# Altium footprint library ST封装.PcbLib: 1336 footprints (part 85 of 109) (continued)
## SQFP28X28-360(T) [mm]
pads (360):
  rect 0.2x1.6 smd: 1(0,0)
  oval 0.2x1.6 smd: 2(-0.3,0) 3(-0.6,0) 4(-0.9,0) 5(-1.2,0) 6(-1.5,0) 7(-1.8,0) 8(-2.1,0) 9(-2.4,0) 10(-2.7,0) 11(-3,0) 12(-3.3,0) 13(-3.6,0) 14(-3.9,0) 15(-4.2,0) 16(-4.5,0) 17(-4.8,0) 18(-5.1,0) 19(-5.4,0) 20(-5.7,0) 21(-6,0) 22(-6.3,0) 23(-6.6,0) 24(-6.9,0) 25(-7.2,0) 26(-7.5,0) 27(-7.8,0) 28(-8.1,0) 29(-8.4,0) 30(-8.7,0) 31(-9,0) 32(-9.3,0) 33(-9.6,0) 34(-9.9,0) 35(-10.2,0) 36(-10.5,0) 37(-10.8,0) 38(-11.1,0) 39(-11.4,0) 40(-11.7,0) 41(-12,0) 42(-12.3,0) 43(-12.6,0) 44(-12.9,0) 45(-13.2,0) 136(-13.2,-29.4) 137(-12.9,-29.4) 138(-12.6,-29.4) 139(-12.3,-29.4) 140(-12,-29.4) 141(-11.7,-29.4) 142(-11.4,-29.4) 143(-11.1,-29.4) 144(-10.8,-29.4) 145(-10.5,-29.4) 146(-10.2,-29.4) 147(-9.9,-29.4) 148(-9.6,-29.4) 149(-9.3,-29.4) 150(-9,-29.4) 151(-8.7,-29.4) 152(-8.4,-29.4) 153(-8.1,-29.4) 154(-7.8,-29.4) 155(-7.5,-29.4) 156(-7.2,-29.4) 157(-6.9,-29.4) 158(-6.6,-29.4) 159(-6.3,-29.4) 160(-6,-29.4) 161(-5.7,-29.4) 162(-5.4,-29.4) 163(-5.1,-29.4) 164(-4.8,-29.4) 165(-4.5,-29.4) 166(-4.2,-29.4) 167(-3.9,-29.4) 168(-3.6,-29.4) 169(-3.3,-29.4) 170(-3,-29.4) 171(-2.7,-29.4) 172(-2.4,-29.4) 173(-2.1,-29.4) 174(-1.8,-29.4) 175(-1.5,-29.4) 176(-1.2,-29.4) 177(-0.9,-29.4) 178(-0.6,-29.4) 179(-0.3,-29.4) 180(0,-29.4) 181(0.3,-29.4) 182(0.6,-29.4) 183(0.9,-29.4) 184(1.2,-29.4) 185(1.5,-29.4) 186(1.8,-29.4) 187(2.1,-29.4) 188(2.4,-29.4) 189(2.7,-29.4) 190(3,-29.4) 191(3.3,-29.4) 192(3.6,-29.4) 193(3.9,-29.4) 194(4.2,-29.4) 195(4.5,-29.4) 196(4.8,-29.4) 197(5.1,-29.4) 198(5.4,-29.4) 199(5.7,-29.4) 200(6,-29.4) 201(6.3,-29.4) 202(6.6,-29.4) 203(6.9,-29.4) 204(7.2,-29.4) 205(7.5,-29.4) 206(7.8,-29.4) 207(8.1,-29.4) 208(8.4,-29.4) 209(8.7,-29.4) 210(9,-29.4) 211(9.3,-29.4) 212(9.6,-29.4) 213(9.9,-29.4) 214(10.2,-29.4) 215(10.5,-29.4) 216(10.8,-29.4) 217(11.1,-29.4) 218(11.4,-29.4) 219(11.7,-29.4) 220(12,-29.4) 221(12.3,-29.4) 222(12.6,-29.4) 223(12.9,-29.4) 224(13.2,-29.4) 225(13.5,-29.4) 316(13.5,0) 317(13.2,0) 318(12.9,0) 319(12.6,0) 320(12.3,0) 321(12,0) 322(11.7,0) 323(11.4,0) 324(11.1,0) 325(10.8,0) 326(10.5,0) 327(10.2,0) 328(9.9,0) 329(9.6,0) 330(9.3,0) 331(9,0) 332(8.7,0) 333(8.4,0) 334(8.1,0) 335(7.8,0) 336(7.5,0) 337(7.2,0) 338(6.9,0) 339(6.6,0) 340(6.3,0) 341(6,0) 342(5.7,0) 343(5.4,0) 344(5.1,0) 345(4.8,0) 346(4.5,0) 347(4.2,0) 348(3.9,0) 349(3.6,0) 350(3.3,0) 351(3,0) 352(2.7,0) 353(2.4,0) 354(2.1,0) 355(1.8,0) 356(1.5,0) 357(1.2,0) 358(0.9,0) 359(0.6,0) 360(0.3,0)
  oval 1.6x0.2 smd: 46(-14.55,-1.35) 47(-14.55,-1.65) 48(-14.55,-1.95) 49(-14.55,-2.25) 50(-14.55,-2.55) 51(-14.55,-2.85) 52(-14.55,-3.15) 53(-14.55,-3.45) 54(-14.55,-3.75) 55(-14.55,-4.05) 56(-14.55,-4.35) 57(-14.55,-4.65) 58(-14.55,-4.95) 59(-14.55,-5.25) 60(-14.55,-5.55) 61(-14.55,-5.85) 62(-14.55,-6.15) 63(-14.55,-6.45) 64(-14.55,-6.75) 65(-14.55,-7.05) 66(-14.55,-7.35) 67(-14.55,-7.65) 68(-14.55,-7.95) 69(-14.55,-8.25) 70(-14.55,-8.55) 71(-14.55,-8.85) 72(-14.55,-9.15) 73(-14.55,-9.45) 74(-14.55,-9.75) 75(-14.55,-10.05) 76(-14.55,-10.35) 77(-14.55,-10.65) 78(-14.55,-10.95) 79(-14.55,-11.25) 80(-14.55,-11.55) 81(-14.55,-11.85) 82(-14.55,-12.15) 83(-14.55,-12.45) 84(-14.55,-12.75) 85(-14.55,-13.05) 86(-14.55,-13.35) 87(-14.55,-13.65) 88(-14.55,-13.95) 89(-14.55,-14.25) 90(-14.55,-14.55) 91(-14.55,-14.85) 92(-14.55,-15.15) 93(-14.55,-15.45) 94(-14.55,-15.75) 95(-14.55,-16.05) 96(-14.55,-16.35) 97(-14.55,-16.65) 98(-14.55,-16.95) 99(-14.55,-17.25) 100(-14.55,-17.55) 101(-14.55,-17.85) 102(-14.55,-18.15) 103(-14.55,-18.45) 104(-14.55,-18.75) 105(-14.55,-19.05) 106(-14.55,-19.35) 107(-14.55,-19.65) 108(-14.55,-19.95) 109(-14.55,-20.25) 110(-14.55,-20.55) 111(-14.55,-20.85) 112(-14.55,-21.15) 113(-14.55,-21.45) 114(-14.55,-21.75) 115(-14.55,-22.05) 116(-14.55,-22.35) 117(-14.55,-22.65) 118(-14.55,-22.95) 119(-14.55,-23.25) 120(-14.55,-23.55) 121(-14.55,-23.85) 122(-14.55,-24.15) 123(-14.55,-24.45) 124(-14.55,-24.75) 125(-14.55,-25.05) 126(-14.55,-25.35) 127(-14.55,-25.65) 128(-14.55,-25.95) 129(-14.55,-26.25) 130(-14.55,-26.55) 131(-14.55,-26.85) 132(-14.55,-27.15) 133(-14.55,-27.45) 134(-14.55,-27.75) 135(-14.55,-28.05) 226(14.85,-28.05) 227(14.85,-27.75) 228(14.85,-27.45) 229(14.85,-27.15) 230(14.85,-26.85) 231(14.85,-26.55) 232(14.85,-26.25) 233(14.85,-25.95) 234(14.85,-25.65) 235(14.85,-25.35) 236(14.85,-25.05) 237(14.85,-24.75) 238(14.85,-24.45) 239(14.85,-24.15) 240(14.85,-23.85) 241(14.85,-23.55) 242(14.85,-23.25) 243(14.85,-22.95) 244(14.85,-22.65) 245(14.85,-22.35) 246(14.85,-22.05) 247(14.85,-21.75) 248(14.85,-21.45) 249(14.85,-21.15) 250(14.85,-20.85) 251(14.85,-20.55) 252(14.85,-20.25) 253(14.85,-19.95) 254(14.85,-19.65) 255(14.85,-19.35) 256(14.85,-19.05) 257(14.85,-18.75) 258(14.85,-18.45) 259(14.85,-18.15) 260(14.85,-17.85) 261(14.85,-17.55) 262(14.85,-17.25) 263(14.85,-16.95) 264(14.85,-16.65) 265(14.85,-16.35) 266(14.85,-16.05) 267(14.85,-15.75) 268(14.85,-15.45) 269(14.85,-15.15) 270(14.85,-14.85) 271(14.85,-14.55) 272(14.85,-14.25) 273(14.85,-13.95) 274(14.85,-13.65) 275(14.85,-13.35) 276(14.85,-13.05) 277(14.85,-12.75) 278(14.85,-12.45) 279(14.85,-12.15) 280(14.85,-11.85) 281(14.85,-11.55) 282(14.85,-11.25) 283(14.85,-10.95) 284(14.85,-10.65) 285(14.85,-10.35) 286(14.85,-10.05) 287(14.85,-9.75) 288(14.85,-9.45) 289(14.85,-9.15) 290(14.85,-8.85) 291(14.85,-8.55) 292(14.85,-8.25) 293(14.85,-7.95) 294(14.85,-7.65) 295(14.85,-7.35) 296(14.85,-7.05) 297(14.85,-6.75) 298(14.85,-6.45) 299(14.85,-6.15) 300(14.85,-5.85) 301(14.85,-5.55) 302(14.85,-5.25) 303(14.85,-4.95) 304(14.85,-4.65) 305(14.85,-4.35) 306(14.85,-4.05) 307(14.85,-3.75) 308(14.85,-3.45) 309(14.85,-3.15) 310(14.85,-2.85) 311(14.85,-2.55) 312(14.85,-2.25) 313(14.85,-1.95) 314(14.85,-1.65) 315(14.85,-1.35)
Top Overlay:
  lines w0.2: -14.95,-28.65 -14.95,-29.8 -13.8,-29.8 ; -14.95,-0.75 -14.95,-0.4 -14.15,0.4 -13.8,0.4 ; 14.1,-29.8 15.25,-29.8 15.25,-28.65 ; 14.1,0.4 15.25,0.4 15.25,-0.75

## SQFP28X40-256(N) [mm]
pads (256):
  rect 1.6x0.4 smd: 1(0,0)
  oval 1.6x0.4 smd: 2(0,-0.5) 3(0,-1) 4(0,-1.5) 5(0,-2) 6(0,-2.5) 7(0,-3) 8(0,-3.5) 9(0,-4) 10(0,-4.5) 11(0,-5) 12(0,-5.5) 13(0,-6) 14(0,-6.5) 15(0,-7) 16(0,-7.5) 17(0,-8) 18(0,-8.5) 19(0,-9) 20(0,-9.5) 21(0,-10) 22(0,-10.5) 23(0,-11) 24(0,-11.5) 25(0,-12) 26(0,-12.5) 27(0,-13) 28(0,-13.5) 29(0,-14) 30(0,-14.5) 31(0,-15) 32(0,-15.5) 33(0,-16) 34(0,-16.5) 35(0,-17) 36(0,-17.5) 37(0,-18) 38(0,-18.5) 39(0,-19) 40(0,-19.5) 41(0,-20) 42(0,-20.5) 43(0,-21) 44(0,-21.5) 45(0,-22) 46(0,-22.5) 47(0,-23) 48(0,-23.5) 49(0,-24) 50(0,-24.5) 51(0,-25) 52(0,-25.5) 53(0,-26) 54(0,-26.5) 55(0,-27) 56(0,-27.5) 57(0,-28) 58(0,-28.5) 59(0,-29) 60(0,-29.5) 61(0,-30) 62(0,-30.5) 63(0,-31) 64(0,-31.5) 65(0,-32) 66(0,-32.5) 67(0,-33) 68(0,-33.5) 69(0,-34) 70(0,-34.5) 71(0,-35) 72(0,-35.5) 73(0,-36) 74(0,-36.5) 75(0,-37) 76(0,-37.5) 129(29.4,-37.5) 130(29.4,-37) 131(29.4,-36.5) 132(29.4,-36) 133(29.4,-35.5) 134(29.4,-35) 135(29.4,-34.5) 136(29.4,-34) 137(29.4,-33.5) 138(29.4,-33) 139(29.4,-32.5) 140(29.4,-32) 141(29.4,-31.5) 142(29.4,-31) 143(29.4,-30.5) 144(29.4,-30) 145(29.4,-29.5) 146(29.4,-29) 147(29.4,-28.5) 148(29.4,-28) 149(29.4,-27.5) 150(29.4,-27) 151(29.4,-26.5) 152(29.4,-26) 153(29.4,-25.5) 154(29.4,-25) 155(29.4,-24.5) 156(29.4,-24) 157(29.4,-23.5) 158(29.4,-23) 159(29.4,-22.5) 160(29.4,-22) 161(29.4,-21.5) 162(29.4,-21) 163(29.4,-20.5) 164(29.4,-20) 165(29.4,-19.5) 166(29.4,-19) 167(29.4,-18.5) 168(29.4,-18) 169(29.4,-17.5) 170(29.4,-17) 171(29.4,-16.5) 172(29.4,-16) 173(29.4,-15.5) 174(29.4,-15) 175(29.4,-14.5) 176(29.4,-14) 177(29.4,-13.5) 178(29.4,-13) 179(29.4,-12.5) 180(29.4,-12) 181(29.4,-11.5) 182(29.4,-11) 183(29.4,-10.5) 184(29.4,-10) 185(29.4,-9.5) 186(29.4,-9) 187(29.4,-8.5) 188(29.4,-8) 189(29.4,-7.5) 190(29.4,-7) 191(29.4,-6.5) 192(29.4,-6) 193(29.4,-5.5) 194(29.4,-5) 195(29.4,-4.5) 196(29.4,-4) 197(29.4,-3.5) 198(29.4,-3) 199(29.4,-2.5) 200(29.4,-2) 201(29.4,-1.5) 202(29.4,-1) 203(29.4,-0.5) 204(29.4,0)
  oval 0.4x1.6 smd: 77(1.95,-39.45) 78(2.45,-39.45) 79(2.95,-39.45) 80(3.45,-39.45) 81(3.95,-39.45) 82(4.45,-39.45) 83(4.95,-39.45) 84(5.45,-39.45) 85(5.95,-39.45) 86(6.45,-39.45) 87(6.95,-39.45) 88(7.45,-39.45) 89(7.95,-39.45) 90(8.45,-39.45) 91(8.95,-39.45) 92(9.45,-39.45) 93(9.95,-39.45) 94(10.45,-39.45) 95(10.95,-39.45) 96(11.45,-39.45) 97(11.95,-39.45) 98(12.45,-39.45) 99(12.95,-39.45) 100(13.45,-39.45) 101(13.95,-39.45) 102(14.45,-39.45) 103(14.95,-39.45) 104(15.45,-39.45) 105(15.95,-39.45) 106(16.45,-39.45) 107(16.95,-39.45) 108(17.45,-39.45) 109(17.95,-39.45) 110(18.45,-39.45) 111(18.95,-39.45) 112(19.45,-39.45) 113(19.95,-39.45) 114(20.45,-39.45) 115(20.95,-39.45) 116(21.45,-39.45) 117(21.95,-39.45) 118(22.45,-39.45) 119(22.95,-39.45) 120(23.45,-39.45) 121(23.95,-39.45) 122(24.45,-39.45) 123(24.95,-39.45) 124(25.45,-39.45) 125(25.95,-39.45) 126(26.45,-39.45) 127(26.95,-39.45) 128(27.45,-39.45) 205(27.45,1.95) 206(26.95,1.95) 207(26.45,1.95) 208(25.95,1.95) 209(25.45,1.95) 210(24.95,1.95) 211(24.45,1.95) 212(23.95,1.95) 213(23.45,1.95) 214(22.95,1.95) 215(22.45,1.95) 216(21.95,1.95) 217(21.45,1.95) 218(20.95,1.95) 219(20.45,1.95) 220(19.95,1.95) 221(19.45,1.95) 222(18.95,1.95) 223(18.45,1.95) 224(17.95,1.95) 225(17.45,1.95) 226(16.95,1.95) 227(16.45,1.95) 228(15.95,1.95) 229(15.45,1.95) 230(14.95,1.95) 231(14.45,1.95) 232(13.95,1.95) 233(13.45,1.95) 234(12.95,1.95) 235(12.45,1.95) 236(11.95,1.95) 237(11.45,1.95) 238(10.95,1.95) 239(10.45,1.95) 240(9.95,1.95) 241(9.45,1.95) 242(8.95,1.95) 243(8.45,1.95) 244(7.95,1.95) 245(7.45,1.95) 246(6.95,1.95) 247(6.45,1.95) 248(5.95,1.95) 249(5.45,1.95) 250(4.95,1.95) 251(4.45,1.95) 252(3.95,1.95) 253(3.45,1.95) 254(2.95,1.95) 255(2.45,1.95) 256(1.95,1.95)
Top Overlay:
  lines w0.2: -0.4,-38.2 -0.4,-39.85 1.25,-39.85 ; -0.4,0.7 -0.4,1.55 0.4,2.35 1.25,2.35 ; 28.15,-39.85 29.8,-39.85 29.8,-38.2 ; 28.15,2.35 29.8,2.35 29.8,0.7

## SQFP28X40-256(T) [mm]
pads (256):
  rect 0.4x1.6 smd: 1(0,0)
  oval 0.4x1.6 smd: 2(-0.5,0) 3(-1,0) 4(-1.5,0) 5(-2,0) 6(-2.5,0) 7(-3,0) 8(-3.5,0) 9(-4,0) 10(-4.5,0) 11(-5,0) 12(-5.5,0) 13(-6,0) 14(-6.5,0) 15(-7,0) 16(-7.5,0) 17(-8,0) 18(-8.5,0) 19(-9,0) 20(-9.5,0) 21(-10,0) 22(-10.5,0) 23(-11,0) 24(-11.5,0) 25(-12,0) 26(-12.5,0) 103(-12.5,-41.4) 104(-12,-41.4) 105(-11.5,-41.4) 106(-11,-41.4) 107(-10.5,-41.4) 108(-10,-41.4) 109(-9.5,-41.4) 110(-9,-41.4) 111(-8.5,-41.4) 112(-8,-41.4) 113(-7.5,-41.4) 114(-7,-41.4) 115(-6.5,-41.4) 116(-6,-41.4) 117(-5.5,-41.4) 118(-5,-41.4) 119(-4.5,-41.4) 120(-4,-41.4) 121(-3.5,-41.4) 122(-3,-41.4) 123(-2.5,-41.4) 124(-2,-41.4) 125(-1.5,-41.4) 126(-1,-41.4) 127(-0.5,-41.4) 128(0,-41.4) 129(0.5,-41.4) 130(1,-41.4) 131(1.5,-41.4) 132(2,-41.4) 133(2.5,-41.4) 134(3,-41.4) 135(3.5,-41.4) 136(4,-41.4) 137(4.5,-41.4) 138(5,-41.4) 139(5.5,-41.4) 140(6,-41.4) 141(6.5,-41.4) 142(7,-41.4) 143(7.5,-41.4) 144(8,-41.4) 145(8.5,-41.4) 146(9,-41.4) 147(9.5,-41.4) 148(10,-41.4) 149(10.5,-41.4) 150(11,-41.4) 151(11.5,-41.4) 152(12,-41.4) 153(12.5,-41.4) 154(13,-41.4) 231(13,0) 232(12.5,0) 233(12,0) 234(11.5,0) 235(11,0) 236(10.5,0) 237(10,0) 238(9.5,0) 239(9,0) 240(8.5,0) 241(8,0) 242(7.5,0) 243(7,0) 244(6.5,0) 245(6,0) 246(5.5,0) 247(5,0) 248(4.5,0) 249(4,0) 250(3.5,0) 251(3,0) 252(2.5,0) 253(2,0) 254(1.5,0) 255(1,0) 256(0.5,0)
  oval 1.6x0.4 smd: 27(-14.45,-1.95) 28(-14.45,-2.45) 29(-14.45,-2.95) 30(-14.45,-3.45) 31(-14.45,-3.95) 32(-14.45,-4.45) 33(-14.45,-4.95) 34(-14.45,-5.45) 35(-14.45,-5.95) 36(-14.45,-6.45) 37(-14.45,-6.95) 38(-14.45,-7.45) 39(-14.45,-7.95) 40(-14.45,-8.45) 41(-14.45,-8.95) 42(-14.45,-9.45) 43(-14.45,-9.95) 44(-14.45,-10.45) 45(-14.45,-10.95) 46(-14.45,-11.45) 47(-14.45,-11.95) 48(-14.45,-12.45) 49(-14.45,-12.95) 50(-14.45,-13.45) 51(-14.45,-13.95) 52(-14.45,-14.45) 53(-14.45,-14.95) 54(-14.45,-15.45) 55(-14.45,-15.95) 56(-14.45,-16.45) 57(-14.45,-16.95) 58(-14.45,-17.45) 59(-14.45,-17.95) 60(-14.45,-18.45) 61(-14.45,-18.95) 62(-14.45,-19.45) 63(-14.45,-19.95) 64(-14.45,-20.45) 65(-14.45,-20.95) 66(-14.45,-21.45) 67(-14.45,-21.95) 68(-14.45,-22.45) 69(-14.45,-22.95) 70(-14.45,-23.45) 71(-14.45,-23.95) 72(-14.45,-24.45) 73(-14.45,-24.95) 74(-14.45,-25.45) 75(-14.45,-25.95) 76(-14.45,-26.45) 77(-14.45,-26.95) 78(-14.45,-27.45) 79(-14.45,-27.95) 80(-14.45,-28.45) 81(-14.45,-28.95) 82(-14.45,-29.45) 83(-14.45,-29.95) 84(-14.45,-30.45) 85(-14.45,-30.95) 86(-14.45,-31.45) 87(-14.45,-31.95) 88(-14.45,-32.45) 89(-14.45,-32.95) 90(-14.45,-33.45) 91(-14.45,-33.95) 92(-14.45,-34.45) 93(-14.45,-34.95) 94(-14.45,-35.45) 95(-14.45,-35.95) 96(-14.45,-36.45) 97(-14.45,-36.95) 98(-14.45,-37.45) 99(-14.45,-37.95) 100(-14.45,-38.45) 101(-14.45,-38.95) 102(-14.45,-39.45) 155(14.95,-39.45) 156(14.95,-38.95) 157(14.95,-38.45) 158(14.95,-37.95) 159(14.95,-37.45) 160(14.95,-36.95) 161(14.95,-36.45) 162(14.95,-35.95) 163(14.95,-35.45) 164(14.95,-34.95) 165(14.95,-34.45) 166(14.95,-33.95) 167(14.95,-33.45) 168(14.95,-32.95) 169(14.95,-32.45) 170(14.95,-31.95) 171(14.95,-31.45) 172(14.95,-30.95) 173(14.95,-30.45) 174(14.95,-29.95) 175(14.95,-29.45) 176(14.95,-28.95) 177(14.95,-28.45) 178(14.95,-27.95) 179(14.95,-27.45) 180(14.95,-26.95) 181(14.95,-26.45) 182(14.95,-25.95) 183(14.95,-25.45) 184(14.95,-24.95) 185(14.95,-24.45) 186(14.95,-23.95) 187(14.95,-23.45) 188(14.95,-22.95) 189(14.95,-22.45) 190(14.95,-21.95) 191(14.95,-21.45) 192(14.95,-20.95) 193(14.95,-20.45) 194(14.95,-19.95) 195(14.95,-19.45) 196(14.95,-18.95) 197(14.95,-18.45) 198(14.95,-17.95) 199(14.95,-17.45) 200(14.95,-16.95) 201(14.95,-16.45) 202(14.95,-15.95) 203(14.95,-15.45) 204(14.95,-14.95) 205(14.95,-14.45) 206(14.95,-13.95) 207(14.95,-13.45) 208(14.95,-12.95) 209(14.95,-12.45) 210(14.95,-11.95) 211(14.95,-11.45) 212(14.95,-10.95) 213(14.95,-10.45) 214(14.95,-9.95) 215(14.95,-9.45) 216(14.95,-8.95) 217(14.95,-8.45) 218(14.95,-7.95) 219(14.95,-7.45) 220(14.95,-6.95) 221(14.95,-6.45) 222(14.95,-5.95) 223(14.95,-5.45) 224(14.95,-4.95) 225(14.95,-4.45) 226(14.95,-3.95) 227(14.95,-3.45) 228(14.95,-2.95) 229(14.95,-2.45) 230(14.95,-1.95)
Top Overlay:
  lines w0.2: -14.85,-40.15 -14.85,-41.8 -13.2,-41.8 ; -14.85,-1.25 -14.85,-0.4 -14.05,0.4 -13.2,0.4 ; 13.7,-41.8 15.35,-41.8 15.35,-40.15 ; 13.7,0.4 15.35,0.4 15.35,-1.25

## SQFP28X40-264(N) [mm]
pads (264):
  rect 1.6x0.4 smd: 1(0,0)
  oval 1.6x0.4 smd: 2(0,-0.5) 3(0,-1) 4(0,-1.5) 5(0,-2) 6(0,-2.5) 7(0,-3) 8(0,-3.5) 9(0,-4) 10(0,-4.5) 11(0,-5) 12(0,-5.5) 13(0,-6) 14(0,-6.5) 15(0,-7) 16(0,-7.5) 17(0,-8) 18(0,-8.5) 19(0,-9) 20(0,-9.5) 21(0,-10) 22(0,-10.5) 23(0,-11) 24(0,-11.5) 25(0,-12) 26(0,-12.5) 27(0,-13) 28(0,-13.5) 29(0,-14) 30(0,-14.5) 31(0,-15) 32(0,-15.5) 33(0,-16) 34(0,-16.5) 35(0,-17) 36(0,-17.5) 37(0,-18) 38(0,-18.5) 39(0,-19) 40(0,-19.5) 41(0,-20) 42(0,-20.5) 43(0,-21) 44(0,-21.5) 45(0,-22) 46(0,-22.5) 47(0,-23) 48(0,-23.5) 49(0,-24) 50(0,-24.5) 51(0,-25) 52(0,-25.5) 53(0,-26) 54(0,-26.5) 55(0,-27) 56(0,-27.5) 57(0,-28) 58(0,-28.5) 59(0,-29) 60(0,-29.5) 61(0,-30) 62(0,-30.5) 63(0,-31) 64(0,-31.5) 65(0,-32) 66(0,-32.5) 67(0,-33) 68(0,-33.5) 69(0,-34) 70(0,-34.5) 71(0,-35) 72(0,-35.5) 73(0,-36) 74(0,-36.5) 75(0,-37) 76(0,-37.5) 77(0,-38) 78(0,-38.5) 133(29.4,-38.5) 134(29.4,-38) 135(29.4,-37.5) 136(29.4,-37) 137(29.4,-36.5) 138(29.4,-36) 139(29.4,-35.5) 140(29.4,-35) 141(29.4,-34.5) 142(29.4,-34) 143(29.4,-33.5) 144(29.4,-33) 145(29.4,-32.5) 146(29.4,-32) 147(29.4,-31.5) 148(29.4,-31) 149(29.4,-30.5) 150(29.4,-30) 151(29.4,-29.5) 152(29.4,-29) 153(29.4,-28.5) 154(29.4,-28) 155(29.4,-27.5) 156(29.4,-27) 157(29.4,-26.5) 158(29.4,-26) 159(29.4,-25.5) 160(29.4,-25) 161(29.4,-24.5) 162(29.4,-24) 163(29.4,-23.5) 164(29.4,-23) 165(29.4,-22.5) 166(29.4,-22) 167(29.4,-21.5) 168(29.4,-21) 169(29.4,-20.5) 170(29.4,-20) 171(29.4,-19.5) 172(29.4,-19) 173(29.4,-18.5) 174(29.4,-18) 175(29.4,-17.5) 176(29.4,-17) 177(29.4,-16.5) 178(29.4,-16) 179(29.4,-15.5) 180(29.4,-15) 181(29.4,-14.5) 182(29.4,-14) 183(29.4,-13.5) 184(29.4,-13) 185(29.4,-12.5) 186(29.4,-12) 187(29.4,-11.5) 188(29.4,-11) 189(29.4,-10.5) 190(29.4,-10) 191(29.4,-9.5) 192(29.4,-9) 193(29.4,-8.5) 194(29.4,-8) 195(29.4,-7.5) 196(29.4,-7) 197(29.4,-6.5) 198(29.4,-6) 199(29.4,-5.5) 200(29.4,-5) 201(29.4,-4.5) 202(29.4,-4) 203(29.4,-3.5) 204(29.4,-3) 205(29.4,-2.5) 206(29.4,-2) 207(29.4,-1.5) 208(29.4,-1) 209(29.4,-0.5) 210(29.4,0)
  oval 0.4x1.6 smd: 79(1.45,-39.95) 80(1.95,-39.95) 81(2.45,-39.95) 82(2.95,-39.95) 83(3.45,-39.95) 84(3.95,-39.95) 85(4.45,-39.95) 86(4.95,-39.95) 87(5.45,-39.95) 88(5.95,-39.95) 89(6.45,-39.95) 90(6.95,-39.95) 91(7.45,-39.95) 92(7.95,-39.95) 93(8.45,-39.95) 94(8.95,-39.95) 95(9.45,-39.95) 96(9.95,-39.95) 97(10.45,-39.95) 98(10.95,-39.95) 99(11.45,-39.95) 100(11.95,-39.95) 101(12.45,-39.95) 102(12.95,-39.95) 103(13.45,-39.95) 104(13.95,-39.95) 105(14.45,-39.95) 106(14.95,-39.95) 107(15.45,-39.95) 108(15.95,-39.95) 109(16.45,-39.95) 110(16.95,-39.95) 111(17.45,-39.95) 112(17.95,-39.95) 113(18.45,-39.95) 114(18.95,-39.95) 115(19.45,-39.95) 116(19.95,-39.95) 117(20.45,-39.95) 118(20.95,-39.95) 119(21.45,-39.95) 120(21.95,-39.95) 121(22.45,-39.95) 122(22.95,-39.95) 123(23.45,-39.95) 124(23.95,-39.95) 125(24.45,-39.95) 126(24.95,-39.95) 127(25.45,-39.95) 128(25.95,-39.95) 129(26.45,-39.95) 130(26.95,-39.95) 131(27.45,-39.95) 132(27.95,-39.95) 211(27.95,1.45) 212(27.45,1.45) 213(26.95,1.45) 214(26.45,1.45) 215(25.95,1.45) 216(25.45,1.45) 217(24.95,1.45) 218(24.45,1.45) 219(23.95,1.45) 220(23.45,1.45) 221(22.95,1.45) 222(22.45,1.45) 223(21.95,1.45) 224(21.45,1.45) 225(20.95,1.45) 226(20.45,1.45) 227(19.95,1.45) 228(19.45,1.45) 229(18.95,1.45) 230(18.45,1.45) 231(17.95,1.45) 232(17.45,1.45) 233(16.95,1.45) 234(16.45,1.45) 235(15.95,1.45) 236(15.45,1.45) 237(14.95,1.45) 238(14.45,1.45) 239(13.95,1.45) 240(13.45,1.45) 241(12.95,1.45) 242(12.45,1.45) 243(11.95,1.45) 244(11.45,1.45) 245(10.95,1.45) 246(10.45,1.45) 247(9.95,1.45) 248(9.45,1.45) 249(8.95,1.45) 250(8.45,1.45) 251(7.95,1.45) 252(7.45,1.45) 253(6.95,1.45) 254(6.45,1.45) 255(5.95,1.45) 256(5.45,1.45) 257(4.95,1.45) 258(4.45,1.45) 259(3.95,1.45) 260(3.45,1.45) 261(2.95,1.45) 262(2.45,1.45) 263(1.95,1.45) 264(1.45,1.45)
Top Overlay:
  lines w0.2: -0.4,-39.2 -0.4,-40.35 0.75,-40.35 ; -0.4,0.7 -0.4,1.05 0.4,1.85 0.75,1.85 ; 28.65,-40.35 29.8,-40.35 29.8,-39.2 ; 28.65,1.85 29.8,1.85 29.8,0.7

## SQFP28X40-264(T) [mm]
pads (264):
  rect 0.4x1.6 smd: 1(0,0)
  oval 0.4x1.6 smd: 2(-0.5,0) 3(-1,0) 4(-1.5,0) 5(-2,0) 6(-2.5,0) 7(-3,0) 8(-3.5,0) 9(-4,0) 10(-4.5,0) 11(-5,0) 12(-5.5,0) 13(-6,0) 14(-6.5,0) 15(-7,0) 16(-7.5,0) 17(-8,0) 18(-8.5,0) 19(-9,0) 20(-9.5,0) 21(-10,0) 22(-10.5,0) 23(-11,0) 24(-11.5,0) 25(-12,0) 26(-12.5,0) 27(-13,0) 106(-13,-41.4) 107(-12.5,-41.4) 108(-12,-41.4) 109(-11.5,-41.4) 110(-11,-41.4) 111(-10.5,-41.4) 112(-10,-41.4) 113(-9.5,-41.4) 114(-9,-41.4) 115(-8.5,-41.4) 116(-8,-41.4) 117(-7.5,-41.4) 118(-7,-41.4) 119(-6.5,-41.4) 120(-6,-41.4) 121(-5.5,-41.4) 122(-5,-41.4) 123(-4.5,-41.4) 124(-4,-41.4) 125(-3.5,-41.4) 126(-3,-41.4) 127(-2.5,-41.4) 128(-2,-41.4) 129(-1.5,-41.4) 130(-1,-41.4) 131(-0.5,-41.4) 132(0,-41.4) 133(0.5,-41.4) 134(1,-41.4) 135(1.5,-41.4) 136(2,-41.4) 137(2.5,-41.4) 138(3,-41.4) 139(3.5,-41.4) 140(4,-41.4) 141(4.5,-41.4) 142(5,-41.4) 143(5.5,-41.4) 144(6,-41.4) 145(6.5,-41.4) 146(7,-41.4) 147(7.5,-41.4) 148(8,-41.4) 149(8.5,-41.4) 150(9,-41.4) 151(9.5,-41.4) 152(10,-41.4) 153(10.5,-41.4) 154(11,-41.4) 155(11.5,-41.4) 156(12,-41.4) 157(12.5,-41.4) 158(13,-41.4) 159(13.5,-41.4) 238(13.5,0) 239(13,0) 240(12.5,0) 241(12,0) 242(11.5,0) 243(11,0) 244(10.5,0) 245(10,0) 246(9.5,0) 247(9,0) 248(8.5,0) 249(8,0) 250(7.5,0) 251(7,0) 252(6.5,0) 253(6,0) 254(5.5,0) 255(5,0) 256(4.5,0) 257(4,0) 258(3.5,0) 259(3,0) 260(2.5,0) 261(2,0) 262(1.5,0) 263(1,0) 264(0.5,0)
  oval 1.6x0.4 smd: 28(-14.45,-1.45) 29(-14.45,-1.95) 30(-14.45,-2.45) 31(-14.45,-2.95) 32(-14.45,-3.45) 33(-14.45,-3.95) 34(-14.45,-4.45) 35(-14.45,-4.95) 36(-14.45,-5.45) 37(-14.45,-5.95) 38(-14.45,-6.45) 39(-14.45,-6.95) 40(-14.45,-7.45) 41(-14.45,-7.95) 42(-14.45,-8.45) 43(-14.45,-8.95) 44(-14.45,-9.45) 45(-14.45,-9.95) 46(-14.45,-10.45) 47(-14.45,-10.95) 48(-14.45,-11.45) 49(-14.45,-11.95) 50(-14.45,-12.45) 51(-14.45,-12.95) 52(-14.45,-13.45) 53(-14.45,-13.95) 54(-14.45,-14.45) 55(-14.45,-14.95) 56(-14.45,-15.45) 57(-14.45,-15.95) 58(-14.45,-16.45) 59(-14.45,-16.95) 60(-14.45,-17.45) 61(-14.45,-17.95) 62(-14.45,-18.45) 63(-14.45,-18.95) 64(-14.45,-19.45) 65(-14.45,-19.95) 66(-14.45,-20.45) 67(-14.45,-20.95) 68(-14.45,-21.45) 69(-14.45,-21.95) 70(-14.45,-22.45) 71(-14.45,-22.95) 72(-14.45,-23.45) 73(-14.45,-23.95) 74(-14.45,-24.45) 75(-14.45,-24.95) 76(-14.45,-25.45) 77(-14.45,-25.95) 78(-14.45,-26.45) 79(-14.45,-26.95) 80(-14.45,-27.45) 81(-14.45,-27.95) 82(-14.45,-28.45) 83(-14.45,-28.95) 84(-14.45,-29.45) 85(-14.45,-29.95) 86(-14.45,-30.45) 87(-14.45,-30.95) 88(-14.45,-31.45) 89(-14.45,-31.95) 90(-14.45,-32.45) 91(-14.45,-32.95) 92(-14.45,-33.45) 93(-14.45,-33.95) 94(-14.45,-34.45) 95(-14.45,-34.95) 96(-14.45,-35.45) 97(-14.45,-35.95) 98(-14.45,-36.45) 99(-14.45,-36.95) 100(-14.45,-37.45) 101(-14.45,-37.95) 102(-14.45,-38.45) 103(-14.45,-38.95) 104(-14.45,-39.45) 105(-14.45,-39.95) 160(14.95,-39.95) 161(14.95,-39.45) 162(14.95,-38.95) 163(14.95,-38.45) 164(14.95,-37.95) 165(14.95,-37.45) 166(14.95,-36.95) 167(14.95,-36.45) 168(14.95,-35.95) 169(14.95,-35.45) 170(14.95,-34.95) 171(14.95,-34.45) 172(14.95,-33.95) 173(14.95,-33.45) 174(14.95,-32.95) 175(14.95,-32.45) 176(14.95,-31.95) 177(14.95,-31.45) 178(14.95,-30.95) 179(14.95,-30.45) 180(14.95,-29.95) 181(14.95,-29.45) 182(14.95,-28.95) 183(14.95,-28.45) 184(14.95,-27.95) 185(14.95,-27.45) 186(14.95,-26.95) 187(14.95,-26.45) 188(14.95,-25.95) 189(14.95,-25.45) 190(14.95,-24.95) 191(14.95,-24.45) 192(14.95,-23.95) 193(14.95,-23.45) 194(14.95,-22.95) 195(14.95,-22.45) 196(14.95,-21.95) 197(14.95,-21.45) 198(14.95,-20.95) 199(14.95,-20.45) 200(14.95,-19.95) 201(14.95,-19.45) 202(14.95,-18.95) 203(14.95,-18.45) 204(14.95,-17.95) 205(14.95,-17.45) 206(14.95,-16.95) 207(14.95,-16.45) 208(14.95,-15.95) 209(14.95,-15.45) 210(14.95,-14.95) 211(14.95,-14.45) 212(14.95,-13.95) 213(14.95,-13.45) 214(14.95,-12.95) 215(14.95,-12.45) 216(14.95,-11.95) 217(14.95,-11.45) 218(14.95,-10.95) 219(14.95,-10.45) 220(14.95,-9.95) 221(14.95,-9.45) 222(14.95,-8.95) 223(14.95,-8.45) 224(14.95,-7.95) 225(14.95,-7.45) 226(14.95,-6.95) 227(14.95,-6.45) 228(14.95,-5.95) 229(14.95,-5.45) 230(14.95,-4.95) 231(14.95,-4.45) 232(14.95,-3.95) 233(14.95,-3.45) 234(14.95,-2.95) 235(14.95,-2.45) 236(14.95,-1.95) 237(14.95,-1.45)
Top Overlay:
  lines w0.2: -14.85,-40.65 -14.85,-41.8 -13.7,-41.8 ; -14.85,-0.75 -14.85,-0.4 -14.05,0.4 -13.7,0.4 ; 14.2,-41.8 15.35,-41.8 15.35,-40.65 ; 14.2,0.4 15.35,0.4 15.35,-0.75

## SQFP28X40-324(N) [mm]
pads (324):
  rect 1.6x0.3 smd: 1(0,0)
  oval 1.6x0.3 smd: 2(0,-0.4) 3(0,-0.8) 4(0,-1.2) 5(0,-1.6) 6(0,-2) 7(0,-2.4) 8(0,-2.8) 9(0,-3.2) 10(0,-3.6) 11(0,-4) 12(0,-4.4) 13(0,-4.8) 14(0,-5.2) 15(0,-5.6) 16(0,-6) 17(0,-6.4) 18(0,-6.8) 19(0,-7.2) 20(0,-7.6) 21(0,-8) 22(0,-8.4) 23(0,-8.8) 24(0,-9.2) 25(0,-9.6) 26(0,-10) 27(0,-10.4) 28(0,-10.8) 29(0,-11.2) 30(0,-11.6) 31(0,-12) 32(0,-12.4) 33(0,-12.8) 34(0,-13.2) 35(0,-13.6) 36(0,-14) 37(0,-14.4) 38(0,-14.8) 39(0,-15.2) 40(0,-15.6) 41(0,-16) 42(0,-16.4) 43(0,-16.8) 44(0,-17.2) 45(0,-17.6) 46(0,-18) 47(0,-18.4) 48(0,-18.8) 49(0,-19.2) 50(0,-19.6) 51(0,-20) 52(0,-20.4) 53(0,-20.8) 54(0,-21.2) 55(0,-21.6) 56(0,-22) 57(0,-22.4) 58(0,-22.8) 59(0,-23.2) 60(0,-23.6) 61(0,-24) 62(0,-24.4) 63(0,-24.8) 64(0,-25.2) 65(0,-25.6) 66(0,-26) 67(0,-26.4) 68(0,-26.8) 69(0,-27.2) 70(0,-27.6) 71(0,-28) 72(0,-28.4) 73(0,-28.8) 74(0,-29.2) 75(0,-29.6) 76(0,-30) 77(0,-30.4) 78(0,-30.8) 79(0,-31.2) 80(0,-31.6) 81(0,-32) 82(0,-32.4) 83(0,-32.8) 84(0,-33.2) 85(0,-33.6) 86(0,-34) 87(0,-34.4) 88(0,-34.8) 89(0,-35.2) 90(0,-35.6) 91(0,-36) 92(0,-36.4) 93(0,-36.8) 94(0,-37.2) 95(0,-37.6) 96(0,-38) 163(29.4,-38) 164(29.4,-37.6) 165(29.4,-37.2) 166(29.4,-36.8) 167(29.4,-36.4) 168(29.4,-36) 169(29.4,-35.6) 170(29.4,-35.2) 171(29.4,-34.8) 172(29.4,-34.4) 173(29.4,-34) 174(29.4,-33.6) 175(29.4,-33.2) 176(29.4,-32.8) 177(29.4,-32.4) 178(29.4,-32) 179(29.4,-31.6) 180(29.4,-31.2) 181(29.4,-30.8) 182(29.4,-30.4) 183(29.4,-30) 184(29.4,-29.6) 185(29.4,-29.2) 186(29.4,-28.8) 187(29.4,-28.4) 188(29.4,-28) 189(29.4,-27.6) 190(29.4,-27.2) 191(29.4,-26.8) 192(29.4,-26.4) 193(29.4,-26) 194(29.4,-25.6) 195(29.4,-25.2) 196(29.4,-24.8) 197(29.4,-24.4) 198(29.4,-24) 199(29.4,-23.6) 200(29.4,-23.2) 201(29.4,-22.8) 202(29.4,-22.4) 203(29.4,-22) 204(29.4,-21.6) 205(29.4,-21.2) 206(29.4,-20.8) 207(29.4,-20.4) 208(29.4,-20) 209(29.4,-19.6) 210(29.4,-19.2) 211(29.4,-18.8) 212(29.4,-18.4) 213(29.4,-18) 214(29.4,-17.6) 215(29.4,-17.2) 216(29.4,-16.8) 217(29.4,-16.4) 218(29.4,-16) 219(29.4,-15.6) 220(29.4,-15.2) 221(29.4,-14.8) 222(29.4,-14.4) 223(29.4,-14) 224(29.4,-13.6) 225(29.4,-13.2) 226(29.4,-12.8) 227(29.4,-12.4) 228(29.4,-12) 229(29.4,-11.6) 230(29.4,-11.2) 231(29.4,-10.8) 232(29.4,-10.4) 233(29.4,-10) 234(29.4,-9.6) 235(29.4,-9.2) 236(29.4,-8.8) 237(29.4,-8.4) 238(29.4,-8) 239(29.4,-7.6) 240(29.4,-7.2) 241(29.4,-6.8) 242(29.4,-6.4) 243(29.4,-6) 244(29.4,-5.6) 245(29.4,-5.2) 246(29.4,-4.8) 247(29.4,-4.4) 248(29.4,-4) 249(29.4,-3.6) 250(29.4,-3.2) 251(29.4,-2.8) 252(29.4,-2.4) 253(29.4,-2) 254(29.4,-1.6) 255(29.4,-1.2) 256(29.4,-0.8) 257(29.4,-0.4) 258(29.4,0)
  oval 0.3x1.6 smd: 97(1.7,-39.7) 98(2.1,-39.7) 99(2.5,-39.7) 100(2.9,-39.7) 101(3.3,-39.7) 102(3.7,-39.7) 103(4.1,-39.7) 104(4.5,-39.7) 105(4.9,-39.7) 106(5.3,-39.7) 107(5.7,-39.7) 108(6.1,-39.7) 109(6.5,-39.7) 110(6.9,-39.7) 111(7.3,-39.7) 112(7.7,-39.7) 113(8.1,-39.7) 114(8.5,-39.7) 115(8.9,-39.7) 116(9.3,-39.7) 117(9.7,-39.7) 118(10.1,-39.7) 119(10.5,-39.7) 120(10.9,-39.7) 121(11.3,-39.7) 122(11.7,-39.7) 123(12.1,-39.7) 124(12.5,-39.7) 125(12.9,-39.7) 126(13.3,-39.7) 127(13.7,-39.7) 128(14.1,-39.7) 129(14.5,-39.7) 130(14.9,-39.7) 131(15.3,-39.7) 132(15.7,-39.7) 133(16.1,-39.7) 134(16.5,-39.7) 135(16.9,-39.7) 136(17.3,-39.7) 137(17.7,-39.7) 138(18.1,-39.7) 139(18.5,-39.7) 140(18.9,-39.7) 141(19.3,-39.7) 142(19.7,-39.7) 143(20.1,-39.7) 144(20.5,-39.7) 145(20.9,-39.7) 146(21.3,-39.7) 147(21.7,-39.7) 148(22.1,-39.7) 149(22.5,-39.7) 150(22.9,-39.7) 151(23.3,-39.7) 152(23.7,-39.7) 153(24.1,-39.7) 154(24.5,-39.7) 155(24.9,-39.7) 156(25.3,-39.7) 157(25.7,-39.7) 158(26.1,-39.7) 159(26.5,-39.7) 160(26.9,-39.7) 161(27.3,-39.7) 162(27.7,-39.7) 259(27.7,1.7) 260(27.3,1.7) 261(26.9,1.7) 262(26.5,1.7) 263(26.1,1.7) 264(25.7,1.7) 265(25.3,1.7) 266(24.9,1.7) 267(24.5,1.7) 268(24.1,1.7) 269(23.7,1.7) 270(23.3,1.7) 271(22.9,1.7) 272(22.5,1.7) 273(22.1,1.7) 274(21.7,1.7) 275(21.3,1.7) 276(20.9,1.7) 277(20.5,1.7) 278(20.1,1.7) 279(19.7,1.7) 280(19.3,1.7) 281(18.9,1.7) 282(18.5,1.7) 283(18.1,1.7) 284(17.7,1.7) 285(17.3,1.7) 286(16.9,1.7) 287(16.5,1.7) 288(16.1,1.7) 289(15.7,1.7) 290(15.3,1.7) 291(14.9,1.7) 292(14.5,1.7) 293(14.1,1.7) 294(13.7,1.7) 295(13.3,1.7) 296(12.9,1.7) 297(12.5,1.7) 298(12.1,1.7) 299(11.7,1.7) 300(11.3,1.7) 301(10.9,1.7) 302(10.5,1.7) 303(10.1,1.7) 304(9.7,1.7) 305(9.3,1.7) 306(8.9,1.7) 307(8.5,1.7) 308(8.1,1.7) 309(7.7,1.7) 310(7.3,1.7) 311(6.9,1.7) 312(6.5,1.7) 313(6.1,1.7) 314(5.7,1.7) 315(5.3,1.7) 316(4.9,1.7) 317(4.5,1.7) 318(4.1,1.7) 319(3.7,1.7) 320(3.3,1.7) 321(2.9,1.7) 322(2.5,1.7) 323(2.1,1.7) 324(1.7,1.7)
Top Overlay:
  lines w0.2: -0.4,-38.65 -0.4,-40.1 1.05,-40.1 ; -0.4,0.65 -0.4,1.3 0.4,2.1 1.05,2.1 ; 28.35,-40.1 29.8,-40.1 29.8,-38.65 ; 28.35,2.1 29.8,2.1 29.8,0.65